# Altium footprint library PcbLib1.PcbLib: 209 footprints (part 12 of 14)
Each footprint in its own frame and in the unit in brackets; x right, y up, seen from the top. Pads: shape width x height; smd on the part's side, far side on the other; paste and mask are expansions set on the pad; w line width, h text height; cw(c..) or ccw(c..) is an arc to the next point about the centre after c.
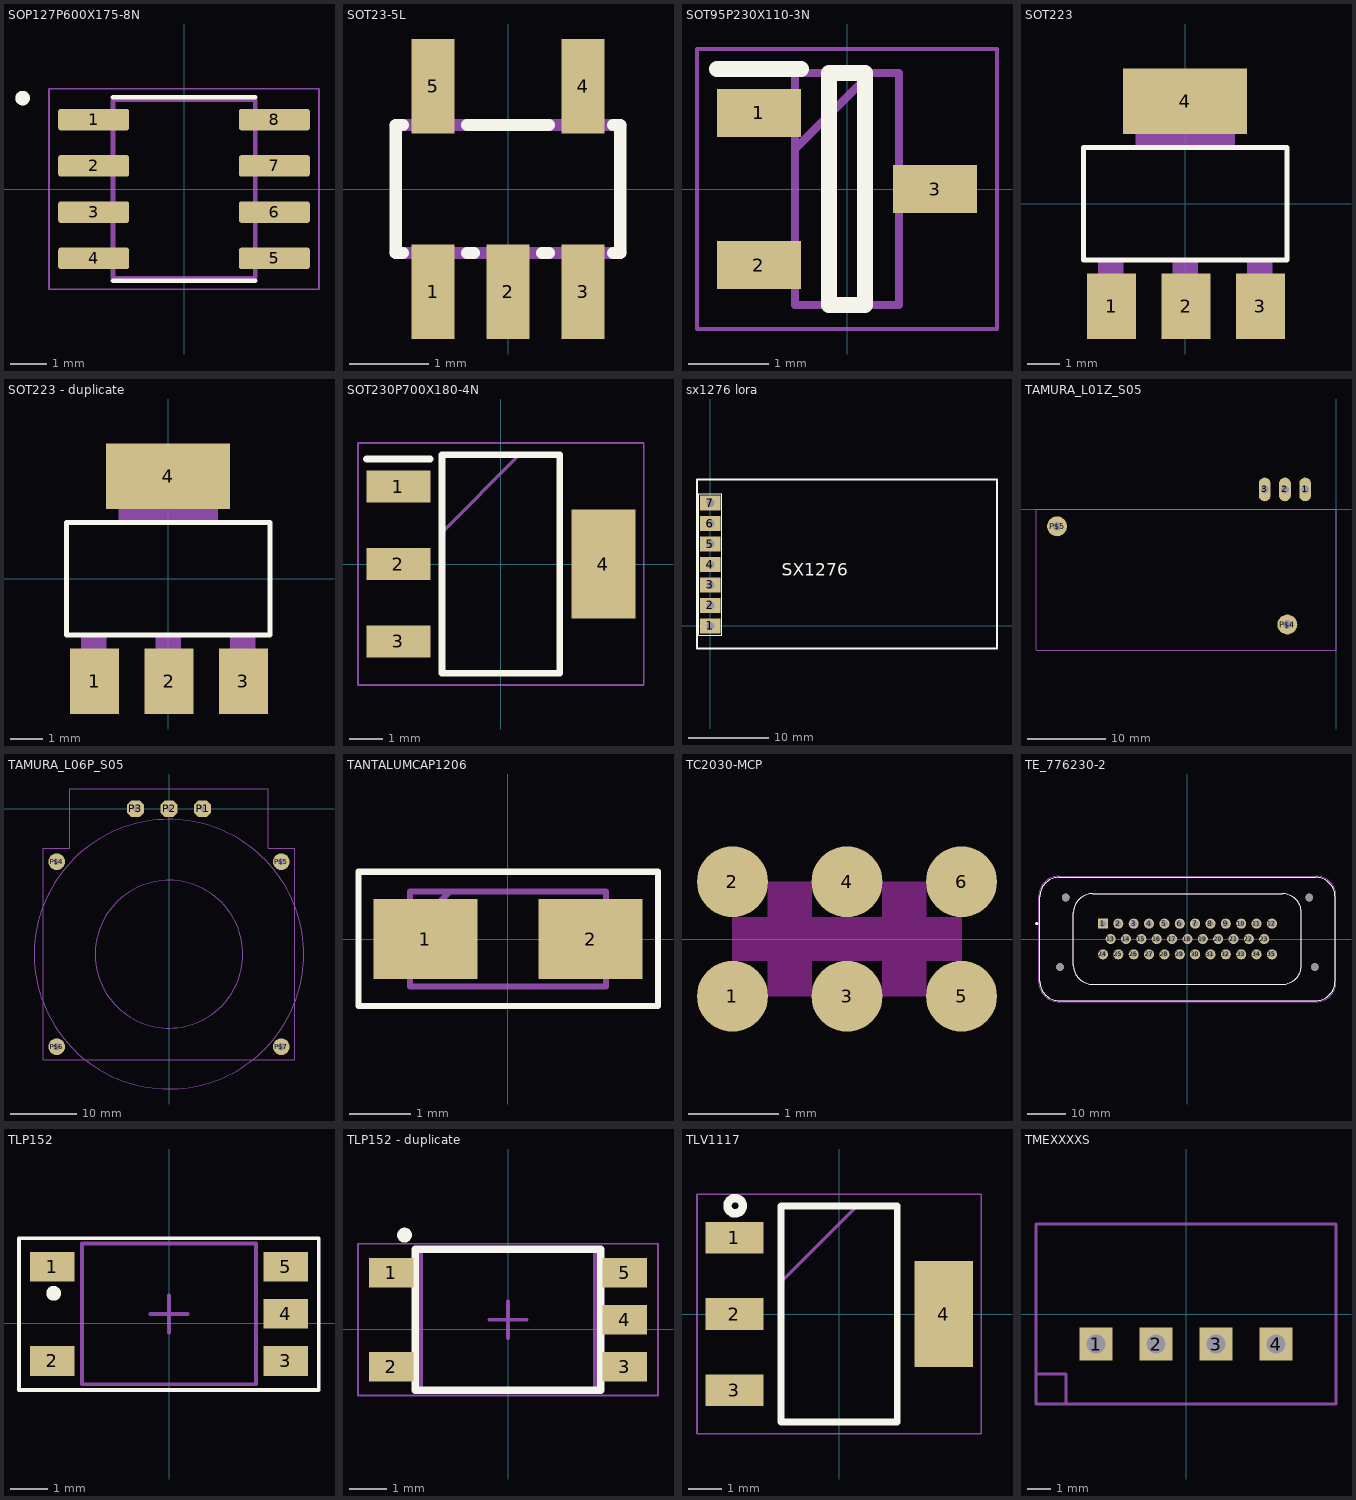
[diagram p11: the footprints below, top view; thin cyan lines are the x and y axes]

## SOP127P600X175-8N [mm]
pads (8):
  rrect25% 1.95x0.59 smd: 1(-2.48,1.905) 2(-2.48,0.635) 3(-2.48,-0.635) 4(-2.48,-1.905) 5(2.48,-1.905) 6(2.48,-0.635) 7(2.48,0.635) 8(2.48,1.905)
Top Overlay:
  circle w0.2: c-4.43,2.495 r0.1
  lines w0.127: -1.95,-2.52 1.95,-2.52 ; -1.95,2.52 1.95,2.52
Mechanical 13:
  circle w0.2: c-4.43,2.495 r0.1
  lines w0.127: -1.95,-2.45 -1.95,2.45 1.95,2.45 1.95,-2.45 -1.95,-2.45
Mechanical 15:
  lines w0.05: -3.705,-2.75 -3.705,2.75 3.705,2.75 3.705,-2.75 -3.705,-2.75
3D body "step_temp.STEP": height 2.1, standoff 0, extent -3,-2.425 3,2.425

## SOT23-5L [mm] "SOT23-5L"
pads (5):
  rect 0.55x1.2 smd: 1(-0.95,-1.3) 2(0,-1.3) 3(0.95,-1.3) 4(0.95,1.3) 5(-0.95,1.3)
Top Overlay:
  lines w0.152: -1.328,-0.81 -1.422,-0.81 -1.422,0.81 -1.328,0.81 ; -0.522,-0.81 -0.428,-0.81 ; -0.522,0.81 0.522,0.81 ; 0.428,-0.81 0.522,-0.81 ; 1.328,-0.81 1.422,-0.81 1.422,0.81 1.328,0.81
Bottom Assembly:
  region: -1.2,0.85 -1.2,1.5 -0.7,1.5 -0.7,0.85
  region: 0.7,0.85 0.7,1.5 1.2,1.5 1.2,0.85
  region: 0.7,-1.5 0.7,-0.85 1.2,-0.85 1.2,-1.5
  region: -0.25,-1.5 -0.25,-0.85 0.25,-0.85 0.25,-1.5
  region: -1.2,-1.5 -1.2,-0.85 -0.7,-0.85 -0.7,-1.5
  lines w0.152: -1.422,-0.81 1.422,-0.81 ; -1.422,0.81 1.422,0.81
3D body "SOT23_5.stp": height 0.92, standoff 0.01, extent -1.5,-1.675 1.5,1.53

## SOT95P230X110-3N [mm]
pads (3):
  rect 1.05x0.6 smd: 1(-1.1,0.95) 2(-1.1,-0.95) 3(1.1,0)
Top Overlay:
  lines w0.2: -1.625,1.5 -0.575,1.5 ; -0.225,-1.45 0.225,-1.45 0.225,1.45 -0.225,1.45 -0.225,-1.45
Mechanical 13:
  lines w0.1: -0.65,0.5 0.3,1.45 ; -0.65,-1.45 0.65,-1.45 0.65,1.45 -0.65,1.45 -0.65,-1.45
Mechanical 15:
  lines w0.05: -1.875,-1.75 1.875,-1.75 1.875,1.75 -1.875,1.75 -1.875,-1.75
3D body "BC817-40,235.stp": height 1.1, standoff 0, extent -1.15,-1.45 1.15,1.45

## SOT223 [mil] "SOT223"
pads (4):
  rect 59x79 smd: 1(-89,-124) 2(1,-124) 3(91,-124)
  rect 150x79 smd: 4(0,124)
Top Overlay:
  lines w6: -122.99,-68.07 -122.99,68.15 122.99,68.15 122.99,-68.07 -122.99,-68.07
Bottom Assembly:
  region: -60,70 -60,130 60,130 60,70
  region: -105,-130 -105,-70 -75,-70 -75,-130
  region: 75,-130 75,-70 105,-70 105,-130
  region: -15,-130 -15,-70 15,-70 15,-130
3D body "SOT223.STEP": height 63.49, standoff -3.42, extent -123.03,-142.69 132.87,133.86

## SOT223 - duplicate [mil] "SOT223"
pads (4):
  rect 59x79 smd: 1(-89,-124) 2(1,-124) 3(91,-124)
  rect 150x79 smd: 4(0,124)
Top Overlay:
  lines w6: -122.99,-68.07 -122.99,68.15 122.99,68.15 122.99,-68.07 -122.99,-68.07
Bottom Assembly:
  region: -60,70 -60,130 60,130 60,70
  region: -105,-130 -105,-70 -75,-70 -75,-130
  region: 75,-130 75,-70 105,-70 105,-130
  region: -15,-130 -15,-70 15,-70 15,-130
3D body "SOT223.STEP": height 63.49, standoff -3.42, extent -123.03,-142.69 132.87,133.86

## SOT230P700X180-4N [mm]
pads (4):
  rect 1.9x0.95 smd: 1(-3.05,2.3) 2(-3.05,0) 3(-3.05,-2.3)
  rect 1.9x3.25 smd: 4(3.05,0)
Top Overlay:
  lines w0.2: -4,3.125 -2.1,3.125 ; -1.75,-3.25 1.75,-3.25 1.75,3.25 -1.75,3.25 -1.75,-3.25
Mechanical 13:
  lines w0.1: -1.75,0.95 0.55,3.25 ; -1.75,-3.25 1.75,-3.25 1.75,3.25 -1.75,3.25 -1.75,-3.25
Mechanical 15:
  lines w0.05: -4.25,-3.6 4.25,-3.6 4.25,3.6 -4.25,3.6 -4.25,-3.6
3D body "IRFL9110PBF.stp": height 1.8, standoff 0, extent -3.5,-3.25 3.5,3.25

## sx1276 lora [mm]
pads (7):
  rect 2.5x1.9 hole 1: 1(0,0) 2(0,2.54) 3(0,5.08) 4(0,7.62) 5(0,10.16) 6(0,12.7) 7(0,15.24)
Top Overlay:
  lines w0.1: -1.436,-1.143 -0.741,-1.143 0.261,-1.143 1.423,-1.143 1.423,16.383 -1.436,16.383 -1.436,-1.143
  lines w0.254: -1.651,16.383 -1.651,18.161 35.56,18.161 35.56,-2.794 -1.651,-2.794 -1.651,16.637
  text "SX1276" at 8.89,6.223 h1.52
3D body "E32-868T30D_Assembly_with_UART_Header_and_Antenna.STEP": height 91.39, standoff -6.68, extent -1.615,-4.316 66.881,19.684

## TAMURA_L01Z_S05 [mm] "TAMURA_L01Z_S05"
pads (5):
  oval 1.508x3.016 / inner round 0 / far side oval 1.508x3.016 hole 1: 1(-3.92,2.5) 2(-6.5,2.5) 3(-9.08,2.5)
  round 2.54 / inner round 0 / far side round 2.54 hole 1.1: P$4(-6.2,-14.7) P$5(-35.52,-2.2)
Bottom 3D Body:
  lines w0.127: -38.2,-18 0,-18 0,0 -38.2,0 -38.2,-18
  text "L01Z    S05" at -29.21,-10.16 h3.94
3D body: height 1.27, standoff 0, extent -36.801,-3.481 -34.239,-0.919
3D body: height 1.27, standoff 0, extent -7.481,-15.981 -4.919,-13.419
3D body: height 1.27, standoff 0, extent -9.84,0.986 -8.319,4.015
3D body: height 1.27, standoff 0, extent -7.261,0.986 -5.74,4.015
3D body: height 1.27, standoff 0, extent -4.68,0.986 -3.159,4.015

## TAMURA_L06P_S05 [mm] "TAMURA_L06P_S05"
pads (7):
  oct 2.54x2.54 / inner round 0 / far side oct 2.54x2.54 hole 0.8: P1(5.08,0) P2(0,0) P3(-5.08,0)
  round 2.54 / inner round 0 / far side round 2.54 hole 1: P$4(-17,-8) P$5(17,-8)
  round 2.54 / inner round 0 / far side round 2.54 hole 1.1: P$6(-17,-36) P$7(17,-36)
Bottom 3D Body:
  circle w0.127: c0,-22 r11.18
  circle w0.127: c0,-22 r20.396
  lines w0.127: -19,-38 19,-38 19,-6 15,-6 15,3 -15,3 -15,-6 -19,-6 -19,-38
3D body: height 1.27, standoff 0, extent -1.183,-1.183 1.183,1.183
3D body: height 1.27, standoff 0, extent -6.263,-1.183 -3.897,1.183
3D body: height 1.27, standoff 0, extent 3.897,-1.183 6.263,1.183
3D body: height 1.27, standoff 0, extent -18.281,-9.281 -15.719,-6.719
3D body: height 1.27, standoff 0, extent 15.719,-9.281 18.281,-6.719
3D body: height 1.27, standoff 0, extent -18.281,-37.281 -15.719,-34.719
3D body: height 1.27, standoff 0, extent 15.719,-37.281 18.281,-34.719

## TANTALUMCAP1206 [mm]
pads (2):
  rect 1.7x1.3 smd: 1(-1.35,0) 2(1.35,0)
Top Overlay:
  lines w0.1: -2.443,-1.093 -2.443,1.099 2.451,1.099 2.451,-1.093 -2.443,-1.093
Mechanical 13:
  lines w0.1: -1.6,0.125 -0.95,0.775 ; -1.6,-0.775 1.6,-0.775 1.6,0.775 -1.6,0.775 -1.6,-0.775
Mechanical 15:
  lines w0.05: -2.45,-1.1 2.45,-1.1 2.45,1.1 -2.45,1.1 -2.45,-1.1
3D body "TAJA104K035KNJ.stp": height 1.8, standoff 0, extent -1.6,-0.775 1.6,0.775

## TC2030-MCP [mil] "TC2030-MCP"
pads (6):
  rrect100% 31x31 smd paste+0: 1(50,-25) 2(50,25) 3(100,-25) 4(100,25) 5(150,-25) 6(150,25)
Top Layer keep-out:
  region: 50,-9.5 65.5,-9.5 65.5,-25 84.5,-25 84.5,-9.5 115.5,-9.5 115.5,-25 134.5,-25 134.5,-9.5 150,-9.5 150,9.5 134.5,9.5 134.5,25 115.5,25 115.5,9.5 84.5,9.5 84.5,25 65.5,25 65.5,9.5 50,9.5

## TE_776230-2 [mm]
pads (39):
  rect 2.625x2.625 hole 1.75: 1(-22,4)
  round 2.625 hole 1.75: 2(-18,4) 3(-14,4) 4(-10,4) 5(-6,4) 6(-2,4) 7(2,4) 8(6,4) 9(10,4) 10(14,4) 11(18,4) 12(22,4) 13(-20,0) 14(-16,0) 15(-12,0) 16(-8,0) 17(-4,0) 18(0,0) 19(4,0) 20(8,0) 21(12,0) 22(16,0) 23(20,0) 24(-22,-4) 25(-18,-4) 26(-14,-4) 27(-10,-4) 28(-6,-4) 29(-2,-4) 30(2,-4) 31(6,-4) 32(10,-4) 33(14,-4) 34(18,-4) 35(22,-4)
  round 2 hole 2 unplated: ""(-33.2,-7.3) ""(-31.7,10.8) ""(31.7,10.8) ""(33.2,-7.3)
Top Overlay:
  circle w0.4: c-39.25,4 r0.2
  lines w0.127: -38.45,-11.05 ccw(c-33.45,-11.05) -33.45,-16.05 33.45,-16.05 ccw(c33.45,-11.05) 38.45,-11.05 38.45,11.05 ccw(c33.45,11.05) 33.45,16.05 -33.45,16.05 ccw(c-33.45,11.05) -38.45,11.05 -38.45,-11.05 ; -29.7,-6.8 ccw(c-24.7,-6.8) -24.7,-11.8 24.7,-11.8 ccw(c24.7,-6.8) 29.7,-6.8 29.7,6.8 ccw(c24.7,6.8) 24.7,11.8 -24.7,11.8 ccw(c-24.7,6.8) -29.7,6.8 -29.7,-6.8
Mechanical 13:
  circle w0.4: c-22,4 r0.2
  lines w0.127: -38.45,-11.05 ccw(c-33.45,-11.05) -33.45,-16.05 33.45,-16.05 ccw(c33.45,-11.05) 38.45,-11.05 38.45,11.05 ccw(c33.45,11.05) 33.45,16.05 -33.45,16.05 ccw(c-33.45,11.05) -38.45,11.05 -38.45,-11.05 ; -29.7,-6.8 ccw(c-24.7,-6.8) -24.7,-11.8 24.7,-11.8 ccw(c24.7,-6.8) 29.7,-6.8 29.7,6.8 ccw(c24.7,6.8) 24.7,11.8 -24.7,11.8 ccw(c-24.7,6.8) -29.7,6.8 -29.7,-6.8
Mechanical 15:
  lines w0.05: -38.7,-11.3 ccw(c-33.7,-11.3) -33.7,-16.3 33.7,-16.3 ccw(c33.7,-11.3) 38.7,-11.3 38.7,11.3 ccw(c33.7,11.3) 33.7,16.3 -33.7,16.3 ccw(c-33.7,11.3) -38.7,11.3 -38.7,-11.3
3D body "776230-2--3DModel-STEP-1.STEP": height 30.48, standoff -7.49, extent -38.434,-15.964 38.466,16.136

## TLP152 [mm] "SOTFL, 5-Leads, Body 3.75x7.20mm, Pitch 1.27mm, IPC Medium Density"
height 2.2
pads (5):
  rect 1.2x0.8 smd: 1(-3.15,1.524) 2(-3.15,-1.016) 3(3.15,-1.016) 4(3.15,0.254) 5(3.15,1.524)
Top Overlay:
  lines w0.1: -4.049,-1.799 -4.048,-1.8 4.042,-1.8 4.044,-1.799 4.044,2.295 -4.049,2.295 -4.049,-1.799
  lines w0.25: -3.041,0.816 ccw(c-3.115,0.809) -3.041,0.808
Top Courtyard:
  lines w0.05: -4.05,-1.796 4.05,-1.796 4.05,2.304 -4.05,2.304 -4.05,-1.796
  lines w0.1: -0.5,0.254 0.5,0.254 ; 0,-0.246 0,0.754
Top Assembly:
  lines w0.1: -2.35,-1.646 2.35,-1.646 2.35,2.154 -2.35,2.154 -2.35,-1.646
3D body "User Library-TLP-152-1.STEP": height 2.11, standoff 0.01, extent -3.393,-1.651 3.383,2.149

## TLP152 - duplicate [mm] "SOTFL, 5-Leads, Body 3.75x7.20mm, Pitch 1.27mm, IPC Medium Density"
height 2.2
pads (5):
  rect 1.2x0.8 smd: 1(-3.15,1.524) 2(-3.15,-1.016) 3(3.15,-1.016) 4(3.15,0.254) 5(3.15,1.524)
Top Overlay:
  lines w0.2: -2.5,-1.646 -2.5,2.154 2.5,2.154 2.5,-1.646 -2.5,-1.646
  lines w0.25: -2.72,2.538 cw(c-2.794,2.54) -2.72,2.547
Top Courtyard:
  lines w0.05: -4.05,-1.796 4.05,-1.796 4.05,2.304 -4.05,2.304 -4.05,-1.796
  lines w0.1: -0.5,0.254 0.5,0.254 ; 0,-0.246 0,0.754
Top Assembly:
  lines w0.1: -2.35,-1.646 2.35,-1.646 2.35,2.154 -2.35,2.154 -2.35,-1.646
3D body "User Library-TLP-152-1.STEP": height 2.11, standoff 0.01, extent -3.393,-1.651 3.383,2.149

## TLV1117 [mm]
pads (4):
  rect 1.75x0.95 smd: 1(-3.15,2.3) 2(-3.15,0) 3(-3.15,-2.3)
  rect 1.75x3.2 smd: 4(3.15,0)
Top Overlay:
  circle w0.254: c-3.127,3.256 r0.231
  lines w0.2: -1.75,-3.25 1.75,-3.25 1.75,3.25 -1.75,3.25 -1.75,-3.25
Mechanical 13:
  lines w0.1: -1.75,0.95 0.55,3.25 ; -1.75,-3.25 1.75,-3.25 1.75,3.25 -1.75,3.25 -1.75,-3.25
Mechanical 15:
  lines w0.05: -4.275,-3.6 4.275,-3.6 4.275,3.6 -4.275,3.6 -4.275,-3.6
3D body "TLV1117-33IDCYR.stp": height 1.8, standoff 0, extent -3.5,-3.25 3.5,3.25

## TMEXXXXS [mil] "TMEXXXXS"
pads (4):
  rect 55x55 / inner round 0 / far side rect 55x55 hole 32: 1(-150,-50) 2(-50,-50) 3(50,-50) 4(150,-50)
Bottom 3D Body:
  lines w5: -250,-100 -250,-150 -200,-150 ; -250,-100 -250,150 250,150 250,-150 -200,-150 ; -250,-100 -200,-100 -200,-150
  text "E-" at -200,0 h77.5
  text "E+" at -100,0 h77.5
  text "A-" at 0,0 h77.5
  text "A+" at 100,0 h77.5
3D body: height 50, standoff 0, extent -175.9,-75.9 -124.1,-24.1
3D body: height 50, standoff 0, extent -75.9,-75.9 -24.1,-24.1
3D body: height 50, standoff 0, extent 24.1,-75.9 75.9,-24.1
3D body: height 50, standoff 0, extent 124.1,-75.9 175.9,-24.1